# Altium integrated library Miscellaneous Devices LC.IntLib: 334 symbols (part 2 of 3) (continued)
## ZXCT1051 (continued)
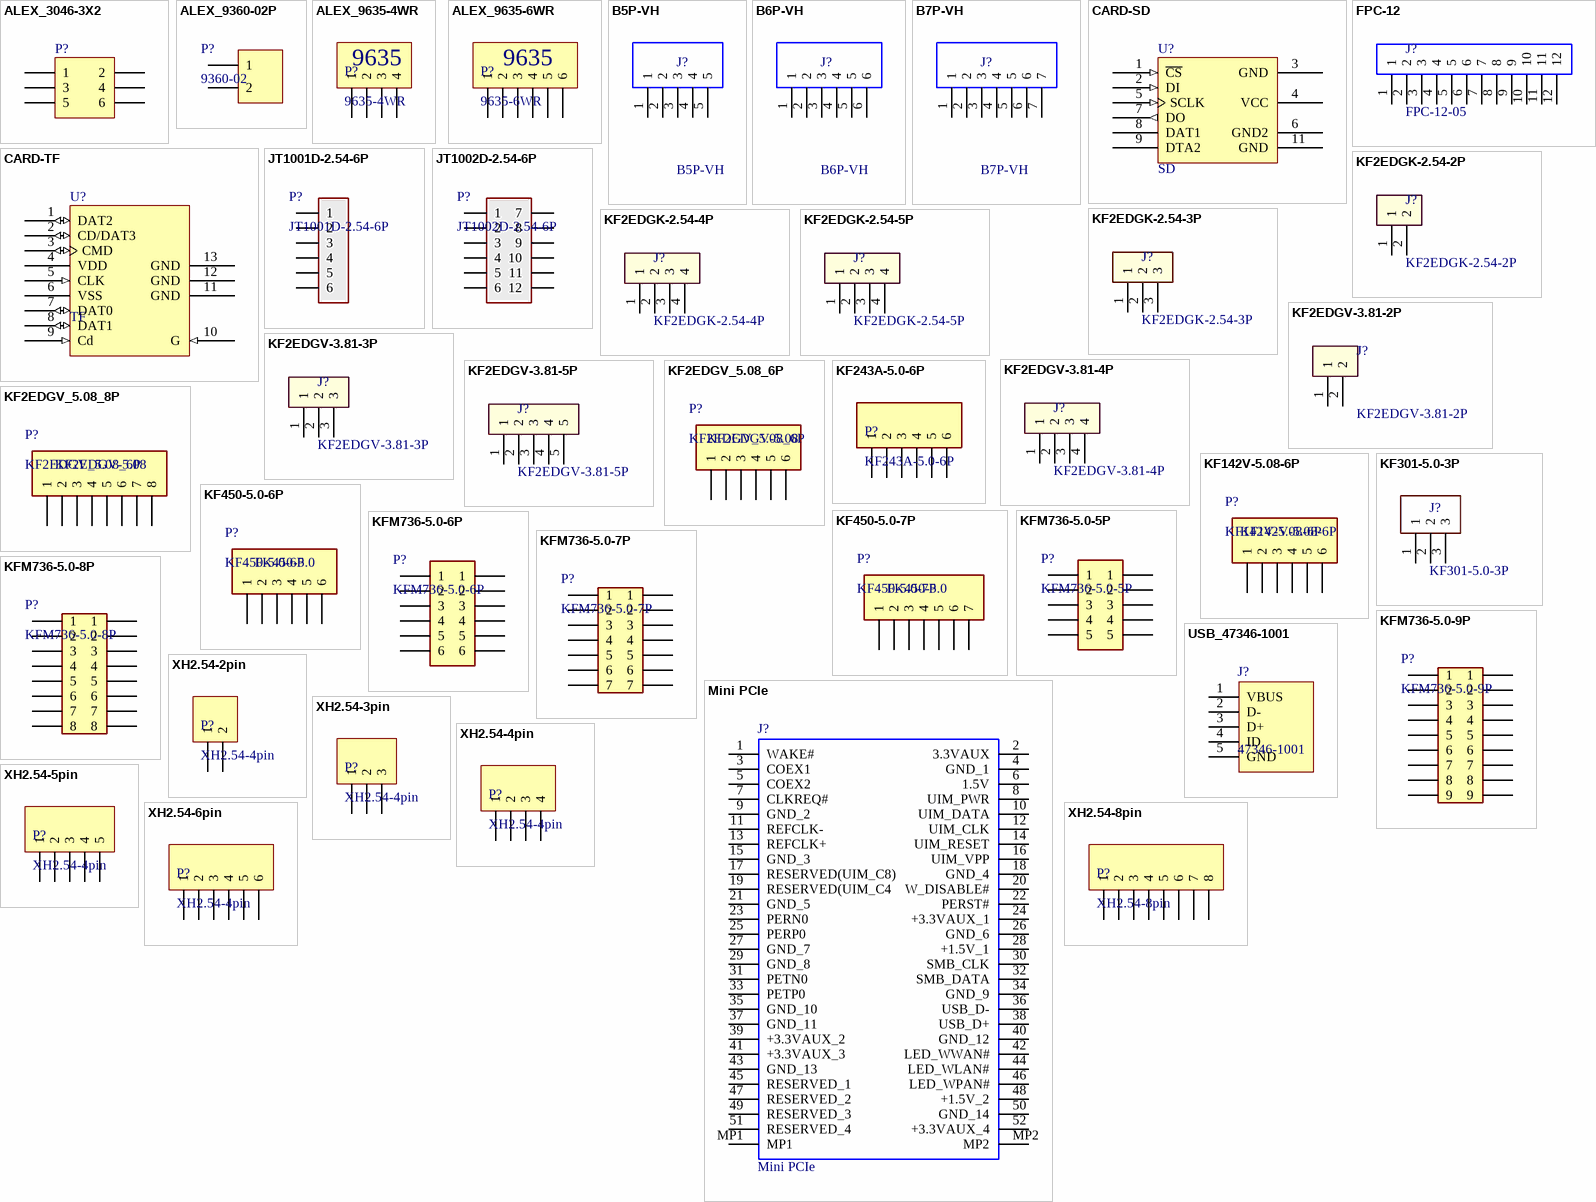
[diagram p17: symbols ALEX_3046-3X2 to XH2.54-8pin]

## ALEX_3046-3X2
designator P?, comment Header 3X2  (value not drawn)
ALEX3046-6P; LatestRevisionDate: 17-Jul-2002; LatestRevisionNote: Re-released for DXP Platform.; Publisher: Altium Limited; ComponentLink1Description: 网络链接; ComponentLink1URL: http://www.alexconn.net/c552.html
footprint ALEX_3046-N (配套3025-N)
pins: 1, 2, 3, 4, 5, 6

## ALEX_9360-02P
designator P?, comment 9360-02
Mini Fit直角接头/ .165“（4.20mm）电源连接器; ComponentLink1Description: 产品网络链接; ComponentLink1URL: http://www.alexconn.net/c521.html
footprint ALEX_9360-2P (Mini Fit直角接头/ .165“（4.20mm）电源连接器)
pins: 1, 2

## ALEX_9635-4WR
designator P?, comment 9635-4WR
直角接头6.35电源连接器; ComponentLink1Description: 产品网络链接; ComponentLink1URL: http://www.alexconn.net/c790.html
footprint ALEX_9635-4WR (Footprint not found)
pins: 1, 2, 3, 4
text: 9635

## ALEX_9635-6WR
designator P?, comment 9635-6WR
直角接头6.35电源连接器; ComponentLink1Description: 产品网络链接; ComponentLink1URL: http://www.alexconn.net/c790.html
footprint ALEX_9635-6WR (亚达康电源连接器)
pins: 1, 2, 3, 4, 5, 6
text: 9635

## B5P-VH
designator J?
VH-3.96mm Header top entry 5 way JST VH Series, Series Number B5P, 3.96mm Pitch 5 Way 1 Row Shrouded Straight PCB Header, Through Hole; Manufacturer_Name: JST (JAPAN SOLDERLESS TERMINALS); Manufacturer_Part_Number: B5P-VH(LF)(SN); Geometry.Height: 10.9mm; RS Part Number: 8201169P; RS Price/Stock: http://china.rs-online.com/web/p/products/8201169P; Arrow Part Number: B5P-VH(LF)(SN); Arrow Price/Stock: https://www.arrow.com/en/products/b5p-vh-lf-sn/jst-manufacturing; Datasheet Link: https://componentsearchengine.com/Datasheets/2/B5P-VH(LF)(SN).pdf; ComponentLink1Description: 供应商; ComponentLink1URL: https://item.taobao.com/item.htm?spm=a230r.1.14.131.16e64711CxwvJs&id=531944925306&ns=1&abbucket=16#detail
footprint B5P-VH
pins: 1, 2, 3, 4, 5

## B6P-VH
designator J?
VH-3.96mm Header top entry 5 way JST VH Series, Series Number B5P, 3.96mm Pitch 5 Way 1 Row Shrouded Straight PCB Header, Through Hole; Manufacturer_Name: JST (JAPAN SOLDERLESS TERMINALS); Manufacturer_Part_Number: B5P-VH(LF)(SN); Geometry.Height: 10.9mm; RS Part Number: 8201169P; RS Price/Stock: http://china.rs-online.com/web/p/products/8201169P; Arrow Part Number: B5P-VH(LF)(SN); Arrow Price/Stock: https://www.arrow.com/en/products/b5p-vh-lf-sn/jst-manufacturing; Datasheet Link: https://componentsearchengine.com/Datasheets/2/B5P-VH(LF)(SN).pdf; ComponentLink1Description: 供应商; ComponentLink1URL: https://item.taobao.com/item.htm?spm=a230r.1.14.131.16e64711CxwvJs&id=531944925306&ns=1&abbucket=16#detail
footprint B6P-VH
pins: 1, 2, 3, 4, 5, 6

## B7P-VH
designator J?
VH-3.96mm Header top entry 5 way JST VH Series, Series Number B5P, 3.96mm Pitch 5 Way 1 Row Shrouded Straight PCB Header, Through Hole; Manufacturer_Name: JST (JAPAN SOLDERLESS TERMINALS); Manufacturer_Part_Number: B5P-VH(LF)(SN); Geometry.Height: 10.9mm; RS Part Number: 8201169P; RS Price/Stock: http://china.rs-online.com/web/p/products/8201169P; Arrow Part Number: B5P-VH(LF)(SN); Arrow Price/Stock: https://www.arrow.com/en/products/b5p-vh-lf-sn/jst-manufacturing; Datasheet Link: https://componentsearchengine.com/Datasheets/2/B5P-VH(LF)(SN).pdf; ComponentLink1Description: 供应商; ComponentLink1URL: https://item.taobao.com/item.htm?spm=a230r.1.14.131.16e64711CxwvJs&id=531944925306&ns=1&abbucket=16#detail
footprint B7P-VH
pins: 1, 2, 3, 4, 5, 6, 7

## CARD-SD
designator U?, comment SD
SD卡槽
footprint CARD-SD
pins: 1 ~{CS} (in), 2 DI (in), 3 GND (power), 4 VCC (power), 5 SCLK (in), 6 GND2 (power), 7 DO (out), 8 DAT1, 9 DTA2, 11 GND (power)

## CARD-TF
designator U?, comment TF
TF卡槽
footprint CARD-TF
pins: 1 DAT2 (io), 2 CD/DAT3 (io), 3 CMD (io), 4 VDD (power), 5 CLK (in), 6 VSS (power), 7 DAT0 (io), 8 DAT1 (io), 9 Cd (in), 10 G (in), 11 GND (power), 12 GND (power), 13 GND (power)

## FPC-12
designator J?, comment FPC-12-05
FPC贴片端子; Manufacturer_Name: CIXI KEFA ELECTRONICS; Manufacturer_Part_Number: KF2EDGV-3.81; Geometry.Height: 9.2mm; Mouser Part Number: *; Mouser Price/Stock: *; RS Part Number: *; RS Price/Stock: *; Datasheet Link: http://en.cnkefa.com/uploads/2016/07/121709071486.pdf; ComponentLink1Description: 生产商; ComponentLink1URL: http://www.sofng.com/FPC/FFCsocket/2015/0331/195.html
footprint FPC-12
pins: 1, 2, 3, 4, 5, 6, 7, 8, 9, 10, 11, 12

## JT1001D-2.54-6P
designator P?
俊腾连接器; ComponentLink1Description: 俊腾连接器; ComponentLink1URL: http://www.nb-junteng.cn/product_info.aspx?id=179&cid=26
pins: 1, 2, 3, 4, 5, 6

## JT1002D-2.54-6P
designator P?
俊腾连接器; ComponentLink1Description: 俊腾连接器; ComponentLink1URL: http://www.nb-junteng.cn/product_info.aspx?id=180&cid=26
pins: 1, 2, 3, 4, 5, 6, 7, 8, 9, 10, 11, 12

## KF2EDGK-2.54-2P
designator J?
科发端子; Manufacturer_Name: CIXI KEFA ELECTRONICS; Manufacturer_Part_Number: KF2EDGV-3.81; Geometry.Height: 9.2mm; Mouser Part Number: *; Mouser Price/Stock: *; RS Part Number: *; RS Price/Stock: *; Datasheet Link: http://en.cnkefa.com/uploads/2016/07/121709071486.pdf; ComponentLink1Description: 科发端子; ComponentLink1URL: http://www.cnkefa.com/product/3141.html
footprint KF2EDGK-2.54-2P
pins: 1, 2

## KF2EDGK-2.54-3P
designator J?
科发端子; Manufacturer_Name: CIXI KEFA ELECTRONICS; Manufacturer_Part_Number: KF2EDGV-3.81; Geometry.Height: 9.2mm; Mouser Part Number: *; Mouser Price/Stock: *; RS Part Number: *; RS Price/Stock: *; Datasheet Link: http://en.cnkefa.com/uploads/2016/07/121709071486.pdf; ComponentLink1Description: 科发端子; ComponentLink1URL: http://www.cnkefa.com/product/3141.html
footprint KF2EDGK-2.54-3P
pins: 1, 2, 3

## KF2EDGK-2.54-4P
designator J?
科发端子; Manufacturer_Name: CIXI KEFA ELECTRONICS; Manufacturer_Part_Number: KF2EDGV-3.81; Geometry.Height: 9.2mm; Mouser Part Number: *; Mouser Price/Stock: *; RS Part Number: *; RS Price/Stock: *; Datasheet Link: http://en.cnkefa.com/uploads/2016/07/121709071486.pdf; ComponentLink1Description: 科发端子; ComponentLink1URL: http://www.cnkefa.com/product/3141.html
footprint KF2EDGK-2.54-4P
pins: 1, 2, 3, 4

## KF2EDGK-2.54-5P
designator J?
科发端子; Manufacturer_Name: CIXI KEFA ELECTRONICS; Manufacturer_Part_Number: KF2EDGV-3.81; Geometry.Height: 9.2mm; Mouser Part Number: *; Mouser Price/Stock: *; RS Part Number: *; RS Price/Stock: *; Datasheet Link: http://en.cnkefa.com/uploads/2016/07/121709071486.pdf; ComponentLink1Description: 科发端子; ComponentLink1URL: http://www.cnkefa.com/product/3141.html
footprint KF2EDGV-3.81-4P
pins: 1, 2, 3, 4

## KF2EDGV-3.81-2P
designator J?
科发端子; Manufacturer_Name: CIXI KEFA ELECTRONICS; Geometry.Height: 9.2mm; Manufacturer_Part_Number: KF2EDGV-3.81; Mouser Part Number: *; Mouser Price/Stock: *; RS Part Number: *; RS Price/Stock: *; Datasheet Link: http://en.cnkefa.com/uploads/2016/07/121709071486.pdf
footprint KF2EDGV-3.81-2P
pins: 1, 2

## KF2EDGV-3.81-3P
designator J?
科发端子; Manufacturer_Name: CIXI KEFA ELECTRONICS; Geometry.Height: 9.2mm; Manufacturer_Part_Number: KF2EDGV-3.81; Mouser Part Number: *; Mouser Price/Stock: *; RS Part Number: *; RS Price/Stock: *; Datasheet Link: http://en.cnkefa.com/uploads/2016/07/121709071486.pdf; ComponentLink1Description: 科发端子; ComponentLink1URL: http://www.cnkefa.com/product/3731.html
footprint KF2EDGV-3.81-3P
pins: 1, 2, 3

## KF2EDGV-3.81-4P
designator J?
科发端子; Manufacturer_Name: CIXI KEFA ELECTRONICS; Geometry.Height: 9.2mm; Manufacturer_Part_Number: KF2EDGV-3.81; Mouser Part Number: *; Mouser Price/Stock: *; RS Part Number: *; RS Price/Stock: *; Datasheet Link: http://en.cnkefa.com/uploads/2016/07/121709071486.pdf; ComponentLink1Description: 科发端子; ComponentLink1URL: http://www.cnkefa.com/product/3731.html
footprint KF2EDGV-3.81-4P
pins: 1, 2, 3, 4

## KF2EDGV-3.81-5P
designator J?
科发端子; Manufacturer_Name: CIXI KEFA ELECTRONICS; Geometry.Height: 9.2mm; Manufacturer_Part_Number: KF2EDGV-3.81; Mouser Part Number: *; Mouser Price/Stock: *; RS Part Number: *; RS Price/Stock: *; Datasheet Link: http://en.cnkefa.com/uploads/2016/07/121709071486.pdf; ComponentLink1Description: 科发端子; ComponentLink1URL: http://www.cnkefa.com/product/3731.html
footprint KF2EDGV-3.81-5P (Footprint not found)
pins: 1, 2, 3, 4, 5

## KF2EDGV_5.08_6P
designator P?
科发端子; ComponentLink1Description: 科发端子; ComponentLink1URL: http://www.cnkefa.com/product/4691.html; ComponentLink2Description: 配套插入端子; ComponentLink2URL: http://www.cnkefa.com/product/3961.html
footprint KF2EDGV-5.08-6P
pins: 1, 2, 3, 4, 5, 6
text: KF2EDGV-5.08

## KF2EDGV_5.08_8P
designator P?, comment KF2EDGV_5.08_6P
科发端子; ComponentLink1Description: 科发端子; ComponentLink1URL: http://www.cnkefa.com/product/4691.html; ComponentLink2Description: 配套插入端子; ComponentLink2URL: http://www.cnkefa.com/product/3961.html
footprint KF2EDGV-5.08-8P
pins: 1, 2, 3, 4, 5, 6, 7, 8
text: KF2EDGV-5.08

## KF142V-5.08-6P
designator P?
科发端子; ComponentLink1Description: 科发端子; ComponentLink1URL: http://www.cnkefa.com/product/2161.html
footprint KF142V-5.08-6P
pins: 1, 2, 3, 4, 5, 6

## KF243A-5.0-6P
designator P?
科发端子
footprint KF243-5.0-6P
pins: 1, 2, 3, 4, 5, 6

## KF301-5.0-3P
designator J?
3pin端子; Manufacturer_Name: CIXI KEFA ELECTRONICS; Manufacturer_Part_Number: KF2EDGV-3.81; Geometry.Height: 9.2mm; Mouser Part Number: *; Mouser Price/Stock: *; RS Part Number: *; RS Price/Stock: *; Datasheet Link: http://en.cnkefa.com/uploads/2016/07/121709071486.pdf; ComponentLink1Description: 科发端子; ComponentLink1URL: http://www.cnkefa.com/product/3141.html
footprint KF301-5.0-3P
pins: 1, 2, 3

## KF450-5.0-6P
designator P?
科发端子; ComponentLink1Description: 科发端子; ComponentLink1URL: http://www.cnkefa.com/product/2471.html
footprint KF450-5.0-6P
pins: 1, 2, 3, 4, 5, 6
text: FK450-5.0

## KF450-5.0-7P
designator P?
科发端子; ComponentLink1Description: 科发端子; ComponentLink1URL: http://www.cnkefa.com/product/2471.html
footprint KF450-5.0-7P
pins: 1, 2, 3, 4, 5, 6, 7
text: FK450-5.0

## KFM736-5.0-5P
designator P?
科发端子; ComponentLink1Description: 科发端子; ComponentLink1URL: http://www.cnkefa.com/product/2471.html
footprint KFM736-5.0-5P
pins: 1, 1, 2, 2, 3, 3, 4, 4, 5, 5

## KFM736-5.0-6P
designator P?
科发端子; ComponentLink1Description: 科发端子; ComponentLink1URL: http://www.cnkefa.com/product/2471.html
footprint KFM736-5.0-6P
pins: 1, 1, 2, 2, 3, 3, 4, 4, 5, 5, 6, 6

## KFM736-5.0-7P
designator P?
科发端子; ComponentLink1Description: 科发端子; ComponentLink1URL: http://www.cnkefa.com/product/2471.html
footprint KFM736-5.0-7P
pins: 1, 1, 2, 2, 3, 3, 4, 4, 5, 5, 6, 6, 7, 7

## KFM736-5.0-8P
designator P?
科发端子; ComponentLink1Description: 科发端子; ComponentLink1URL: http://www.cnkefa.com/product/2471.html
footprint KFM736-5.0-8P
pins: 1, 1, 2, 2, 3, 3, 4, 4, 5, 5, 6, 6, 7, 7, 8, 8

## KFM736-5.0-9P
designator P?
科发端子; ComponentLink1Description: 科发端子; ComponentLink1URL: http://www.cnkefa.com/product/2471.html
footprint KFM736-5.0-9P
pins: 1, 1, 2, 2, 3, 3, 4, 4, 5, 5, 6, 6, 7, 7, 8, 8, 9, 9

## Mini PCIe
designator J?
PCI Express / PCI Connectors mSATA/mini PCI-E 5.2H Type I G/F; Manufacturer_Name: TE Connectivity; Manufacturer_Part_Number: 1775862-2; Geometry.Height: 5.2mm; Mouser Part Number: 571-1775862-2; Mouser Price/Stock: https://www.mouser.com/Search/Refine.aspx?Keyword=571-1775862-2; RS Part Number: *; RS Price/Stock: *; Datasheet Link: https://www.te.com/commerce/DocumentDelivery/DDEController?Action=srchrtrv&DocNm=1775862&DocType=Customer+Drawing&DocLang=English&DocFormat=pdf&PartCntxt=1775862-2
footprint Mini PCIe-C
pins: 1 WAKE#, 2 3.3VAUX, 3 COEX1, 4 GND_1, 5 COEX2, 6 1.5V, 7 CLKREQ#, 8 UIM_PWR, 9 GND_2, 10 UIM_DATA, 11 REFCLK-, 12 UIM_CLK, 13 REFCLK+, 14 UIM_RESET, 15 GND_3, 16 UIM_VPP, 17 RESERVED(UIM_C8), 18 GND_4, 19 RESERVED(UIM_C4, 20 W_DISABLE#, 21 GND_5, 22 PERST#, 23 PERN0, 24 +3.3VAUX_1, 25 PERP0, 26 GND_6, 27 GND_7, 28 +1.5V_1, 29 GND_8, 30 SMB_CLK, 31 PETN0, 32 SMB_DATA, 33 PETP0, 34 GND_9, 35 GND_10, 36 USB_D-, 37 GND_11, 38 USB_D+, 39 +3.3VAUX_2, 40 GND_12, 41 +3.3VAUX_3, 42 LED_WWAN#, 43 GND_13, 44 LED_WLAN#, 45 RESERVED_1, 46 LED_WPAN#, 47 RESERVED_2, 48 +1.5V_2, 49 RESERVED_3, 50 GND_14, 51 RESERVED_4, 52 +3.3VAUX_4, MP1, MP2

## USB_47346-1001
designator J?, comment 47346-1001
USB连接器; Manufacturer_Name: Molex; Manufacturer_Part_Number: 47346-1001; Mouser Part Number: 538-47346-1001; Mouser Price/Stock: https://www.mouser.com/Search/Refine.aspx?Keyword=538-47346-1001; RS Part Number: 1788764; RS Price/Stock: http://uk.rs-online.com/web/p/products/1788764; Datasheet Link: http://www.molex.com/webdocs/datasheets/pdf/en-us/0473461001_IO_CONNECTORS.pdf
footprint 47346-0001
pins: 1 VBUS, 2 D-, 3 D+, 4 ID, 5 GND

## XH2.54-2pin
designator P?, comment XH2.54-4pin
白色端子
footprint XH2.5-2P
pins: 1, 2

## XH2.54-3pin
designator P?, comment XH2.54-4pin
白色端子
footprint XH2.5-3P
pins: 1, 2, 3

## XH2.54-4pin
designator P?
白色端子
footprint XH2.5-4P
pins: 1, 2, 3, 4

## XH2.54-5pin
designator P?, comment XH2.54-4pin
白色端子
footprint XH2.54-5P
pins: 1, 2, 3, 4, 5

## XH2.54-6pin
designator P?, comment XH2.54-4pin
白色端子
footprint XH2.5-6P
pins: 1, 2, 3, 4, 5, 6

## XH2.54-8pin
designator P?
白色端子
footprint XH2.5-8P
pins: 1, 2, 3, 4, 5, 6, 7, 8


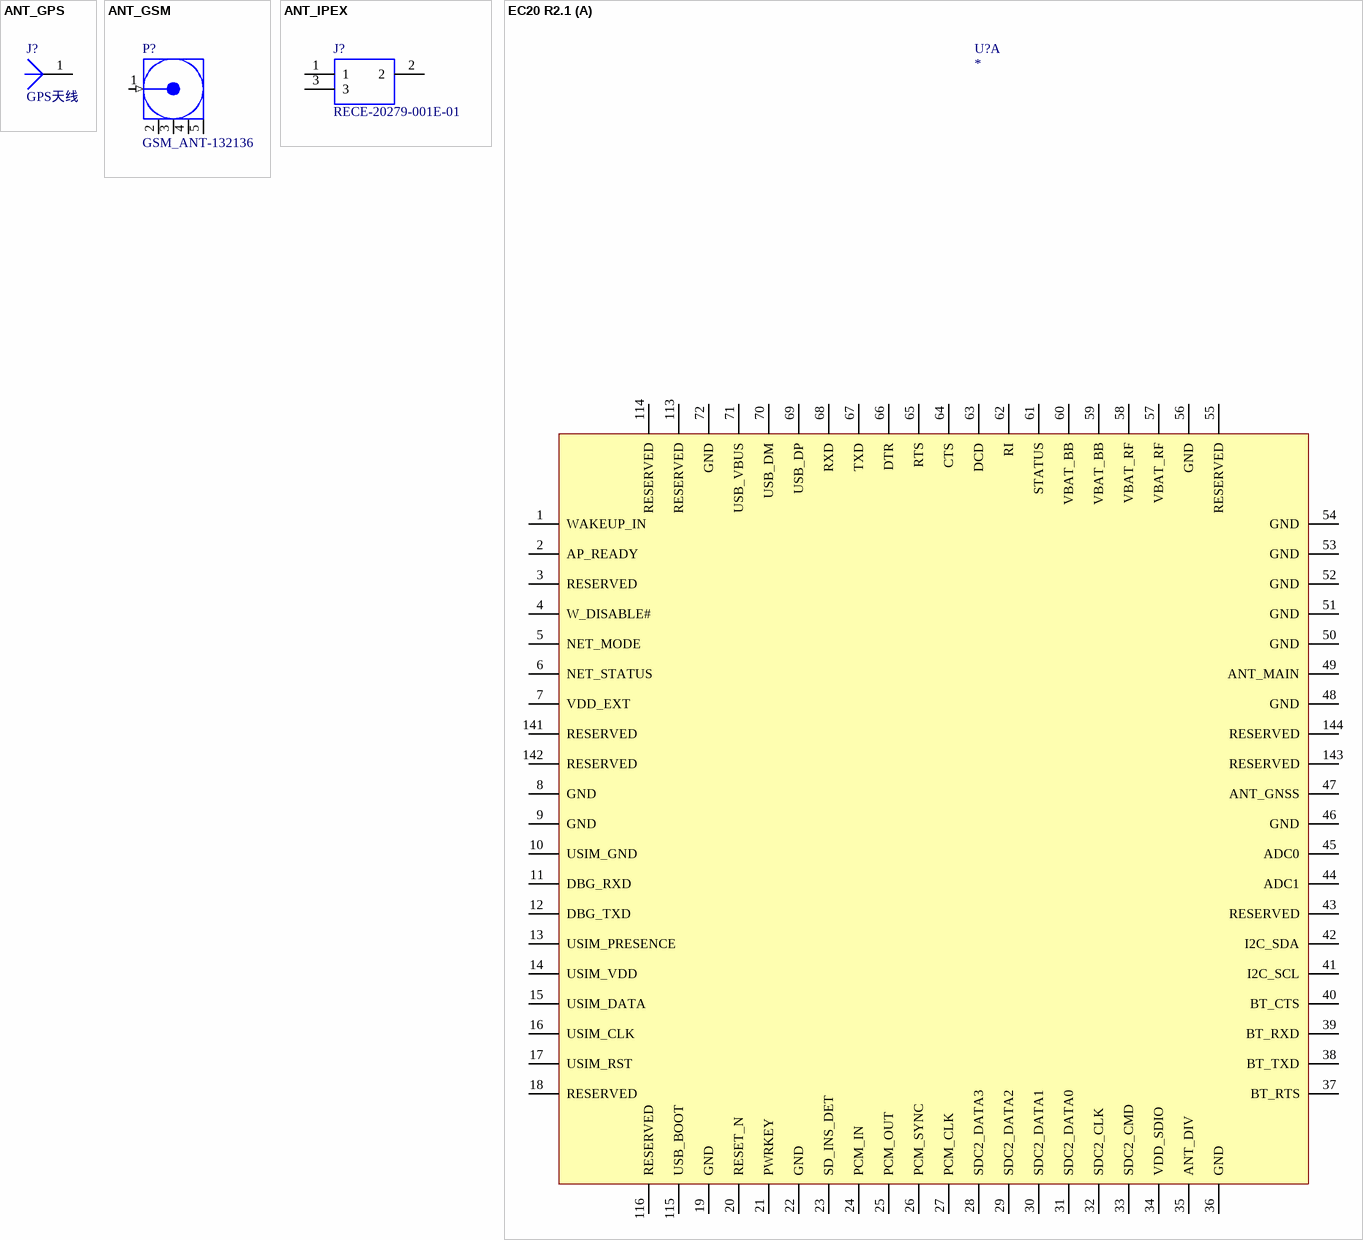
[diagram p18: symbols ANT_GPS to EC20 R2.1]

## ANT_GPS
designator J?, comment GPS天线
footprint ANT18*18*4mm (GPS天线18*18*4mm)
pins: 1

## ANT_GSM
designator P?, comment GSM_ANT-132136
RF Coaxial PCB Connector, MMCX; Thru-Hole, Vertical Mount Plug,  50 Ohm Impedance; PackageDocument: Rev. A, 16-Jun-1997; PCB_Layout: Complies with manufacturer's recommendation.; DrillSize: Corresponds to nominal value.; Published: 15-Jul-2004; LatestRevisionDate: 15-Jul-2004; LatestRevisionNote: Component Replaced.; DatasheetDocument: 30-May-2003; PackageReference: 908-21103; Publisher: Altium Limited; ComponentLink1Description: Manufacturer Link; ComponentLink1URL: http://www.amphenolrf.com/; ComponentLink2Description: 制造链接; ComponentLink2URL: http://www.rfsister.com/products/#; ComponentLink3Description: 销售链接; ComponentLink3URL: http://item.szlcsc.com/140889.html; ComponentLink4Description: 制造链接136134; ComponentLink4URL: https://www.amphenolrf.com/132134.html; ComponentLink5Description: 制造链接132136; ComponentLink5URL: https://www.amphenolrf.com/132136.html
footprint RF_SMA132136 (132136)
footprint RF_SMA132134 (132134)
pins: 1 Signal (in) "Signal Pin", 2 GND (power), 3 GND (power), 4 GND (power), 5 GND (power)

## ANT_IPEX
designator J?, comment RECE-20279-001E-01
RF Connectors / Coaxial Connectors ONBRD IPEX MHF RECEPTACLE; Manufacturer_Name: Taoglas; Manufacturer_Part_Number: RECE-20279-001E-01; RS Part Number: *; RS Price/Stock: *; Mouser Part Number: 960-RECE20279001E01; Mouser Price/Stock: https://www.mouser.com/Search/Refine.aspx?Keyword=960-RECE20279001E01; Datasheet Link: https://www.taoglas.com/wp-content/uploads/2016/04/RECE.20279.001E.01.pdf
footprint ANT_IPEX
pins: 1, 2, 3

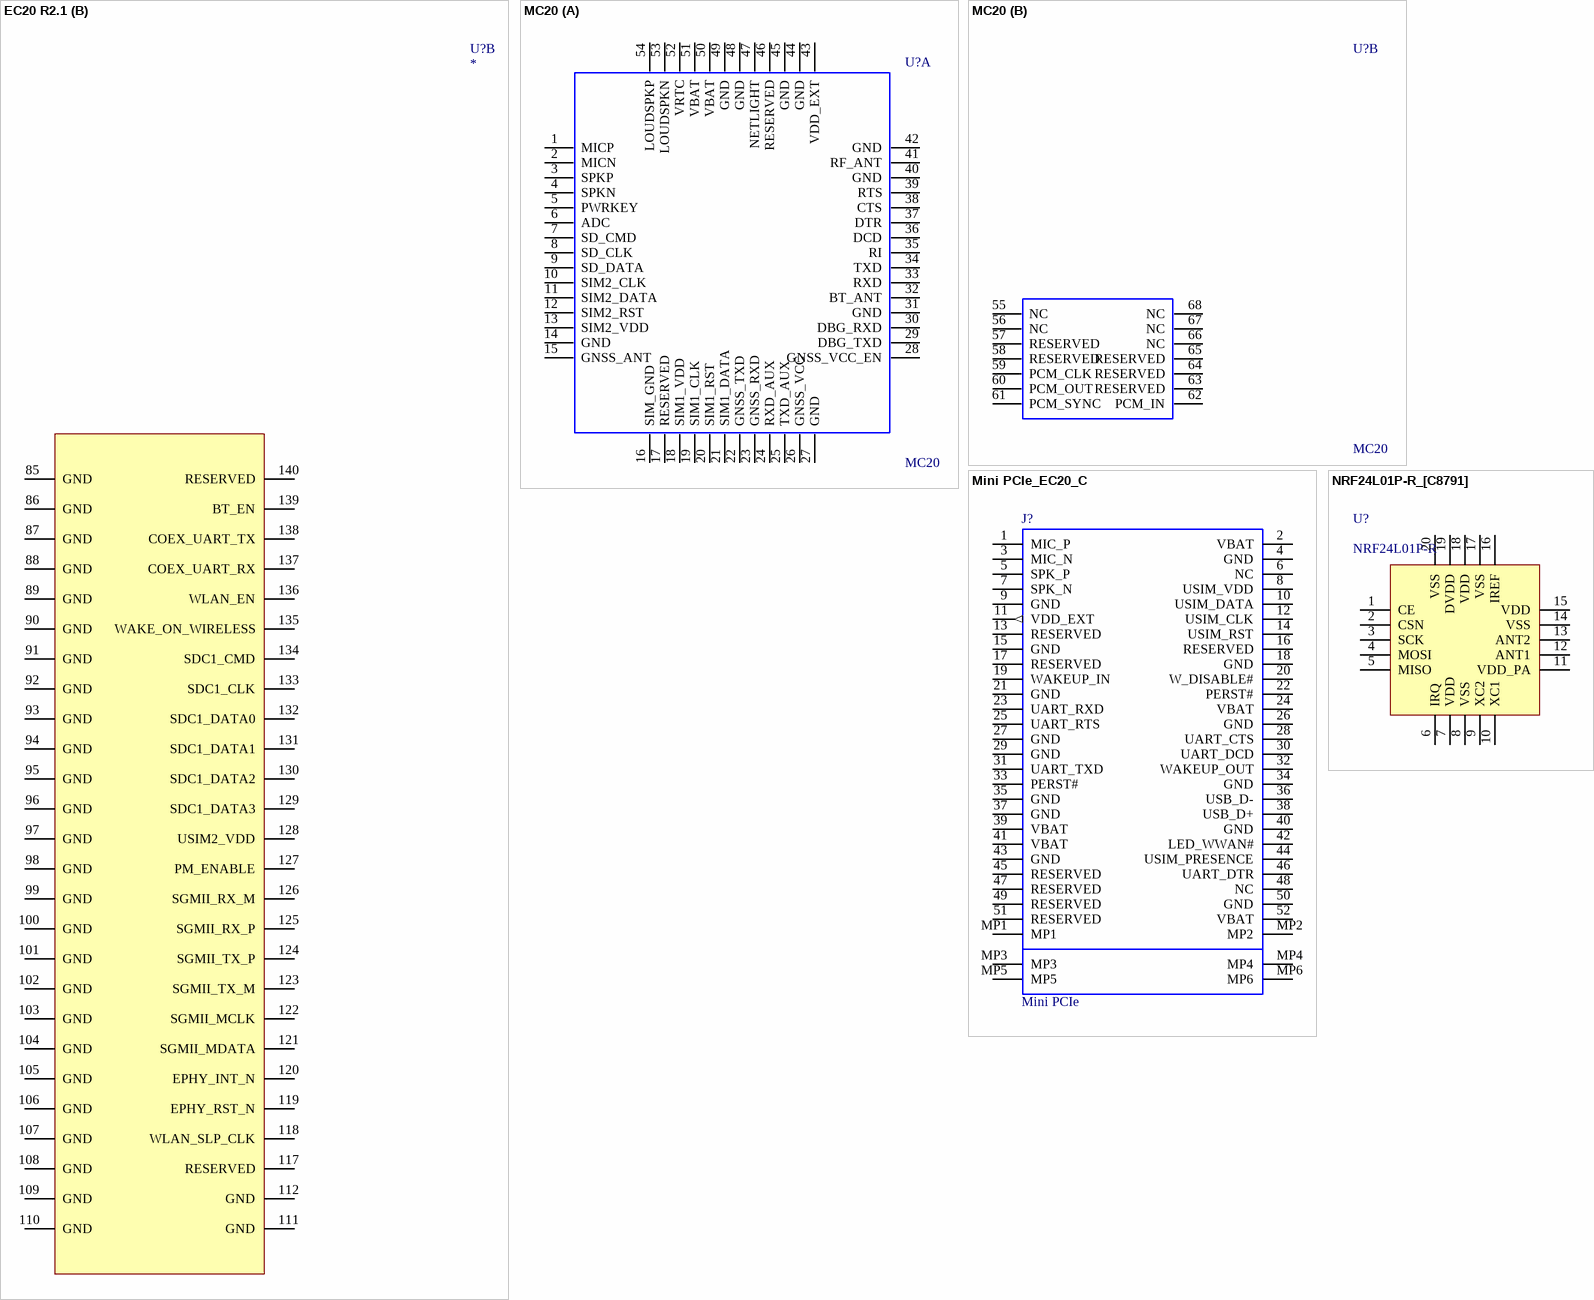
[diagram p19: symbols EC20 R2.1 to NRF24L01P-R_[C8791]]

## EC20 R2.1
designator U?
Value: *; Part Description: *; PCB DECAL: *
footprint EC20_R2.1
part A pins: 1 WAKEUP_IN, 2 AP_READY, 3 RESERVED, 4 W_DISABLE#, 5 NET_MODE, 6 NET_STATUS, 7 VDD_EXT, 8 GND, 9 GND, 10 USIM_GND, 11 DBG_RXD, 12 DBG_TXD, 13 USIM_PRESENCE, 14 USIM_VDD, 15 USIM_DATA, 16 USIM_CLK, 17 USIM_RST, 18 RESERVED, 19 GND, 20 RESET_N, 21 PWRKEY, 22 GND, 23 SD_INS_DET, 24 PCM_IN, 25 PCM_OUT, 26 PCM_SYNC, 27 PCM_CLK, 28 SDC2_DATA3, 29 SDC2_DATA2, 30 SDC2_DATA1, 31 SDC2_DATA0, 32 SDC2_CLK, 33 SDC2_CMD, 34 VDD_SDIO, 35 ANT_DIV, 36 GND, 37 BT_RTS, 38 BT_TXD, 39 BT_RXD, 40 BT_CTS, 41 I2C_SCL, 42 I2C_SDA, 43 RESERVED, 44 ADC1, 45 ADC0, 46 GND, 47 ANT_GNSS, 48 GND, 49 ANT_MAIN, 50 GND, 51 GND, 52 GND, 53 GND, 54 GND, 55 RESERVED, 56 GND, 57 VBAT_RF, 58 VBAT_RF, 59 VBAT_BB, 60 VBAT_BB, 61 STATUS, 62 RI, 63 DCD, 64 CTS, 65 RTS, 66 DTR, 67 TXD, 68 RXD, 69 USB_DP, 70 USB_DM, 71 USB_VBUS, 72 GND, 113 RESERVED, 114 RESERVED, 115 USB_BOOT, 116 RESERVED, 141 RESERVED, 142 RESERVED, 143 RESERVED, 144 RESERVED
part B pins: 85 GND, 86 GND, 87 GND, 88 GND, 89 GND, 90 GND, 91 GND, 92 GND, 93 GND, 94 GND, 95 GND, 96 GND, 97 GND, 98 GND, 99 GND, 100 GND, 101 GND, 102 GND, 103 GND, 104 GND, 105 GND, 106 GND, 107 GND, 108 GND, 109 GND, 110 GND, 111 GND, 112 GND, 117 RESERVED, 118 WLAN_SLP_CLK, 119 EPHY_RST_N, 120 EPHY_INT_N, 121 SGMII_MDATA, 122 SGMII_MCLK, 123 SGMII_TX_M, 124 SGMII_TX_P, 125 SGMII_RX_P, 126 SGMII_RX_M, 127 PM_ENABLE, 128 USIM2_VDD, 129 SDC1_DATA3, 130 SDC1_DATA2, 131 SDC1_DATA1, 132 SDC1_DATA0, 133 SDC1_CLK, 134 SDC1_CMD, 135 WAKE_ON_WIRELESS, 136 WLAN_EN, 137 COEX_UART_RX, 138 COEX_UART_TX, 139 BT_EN, 140 RESERVED
2 alternate drawings of the same symbol

## MC20
designator U?
PCB DECAL: MC20
footprint MC20
part A pins: 1 MICP, 2 MICN, 3 SPKP, 4 SPKN, 5 PWRKEY, 6 ADC, 7 SD_CMD, 8 SD_CLK, 9 SD_DATA, 10 SIM2_CLK, 11 SIM2_DATA, 12 SIM2_RST, 13 SIM2_VDD, 14 GND, 15 GNSS_ANT, 16 SIM_GND, 17 RESERVED, 18 SIM1_VDD, 19 SIM1_CLK, 20 SIM1_RST, 21 SIM1_DATA, 22 GNSS_TXD, 23 GNSS_RXD, 24 RXD_AUX, 25 TXD_AUX, 26 GNSS_VCC, 27 GND, 28 GNSS_VCC_EN, 29 DBG_TXD, 30 DBG_RXD, 31 GND, 32 BT_ANT, 33 RXD, 34 TXD, 35 RI, 36 DCD, 37 DTR, 38 CTS, 39 RTS, 40 GND, 41 RF_ANT, 42 GND, 43 VDD_EXT, 44 GND, 45 GND, 46 RESERVED, 47 NETLIGHT, 48 GND, 49 GND, 50 VBAT, 51 VBAT, 52 VRTC, 53 LOUDSPKN, 54 LOUDSPKP
part B pins: 55 NC, 56 NC, 57 RESERVED, 58 RESERVED, 59 PCM_CLK, 60 PCM_OUT, 61 PCM_SYNC, 62 PCM_IN, 63 RESERVED, 64 RESERVED, 65 RESERVED, 66 NC, 67 NC, 68 NC

## Mini PCIe_EC20_C
designator J?, comment Mini PCIe
PCI Express / PCI Connectors mSATA/mini PCI-E 5.2H Type I G/F; Manufacturer_Name: TE Connectivity; Manufacturer_Part_Number: 1775862-2; Geometry.Height: 5.2mm; Mouser Part Number: 571-1775862-2; Mouser Price/Stock: https://www.mouser.com/Search/Refine.aspx?Keyword=571-1775862-2; RS Part Number: *; RS Price/Stock: *; Datasheet Link: https://www.te.com/commerce/DocumentDelivery/DDEController?Action=srchrtrv&DocNm=1775862&DocType=Customer+Drawing&DocLang=English&DocFormat=pdf&PartCntxt=1775862-2
footprint Mini PCIe-EC20
pins: 1 MIC_P, 2 VBAT, 3 MIC_N, 4 GND, 5 SPK_P, 6 NC, 7 SPK_N, 8 USIM_VDD, 9 GND, 10 USIM_DATA, 11 VDD_EXT (out), 12 USIM_CLK, 13 RESERVED, 14 USIM_RST, 15 GND, 16 RESERVED, 17 RESERVED, 18 GND, 19 WAKEUP_IN, 20 W_DISABLE#, 21 GND, 22 PERST#, 23 UART_RXD, 24 VBAT, 25 UART_RTS, 26 GND, 27 GND, 28 UART_CTS, 29 GND, 30 UART_DCD, 31 UART_TXD, 32 WAKEUP_OUT, 33 PERST#, 34 GND, 35 GND, 36 USB_D-, 37 GND, 38 USB_D+, 39 VBAT, 40 GND, 41 VBAT, 42 LED_WWAN#, 43 GND, 44 USIM_PRESENCE, 45 RESERVED, 46 UART_DTR, 47 RESERVED, 48 NC, 49 RESERVED, 50 GND, 51 RESERVED, 52 VBAT, MP1, MP2, MP3, MP4, MP5, MP6

## NRF24L01P-R_[C8791]
designator U?, comment NRF24L01P-R
无线; ComponentLink1Description: 供应商链接; ComponentLink1URL: http://www.szlcsc.com/product/details_9305.html; Package: QFN-20_4x4x05P; Supplier: LC; SuppliersPartNumber: C8791
footprint QFN-20_4x4x05P
pins: 1 CE, 2 CSN, 3 SCK, 4 MOSI, 5 MISO, 6 IRQ, 7 VDD, 8 VSS, 9 XC2, 10 XC1, 11 VDD_PA, 12 ANT1, 13 ANT2, 14 VSS, 15 VDD, 16 IREF, 17 VSS, 18 VDD, 19 DVDD, 20 VSS

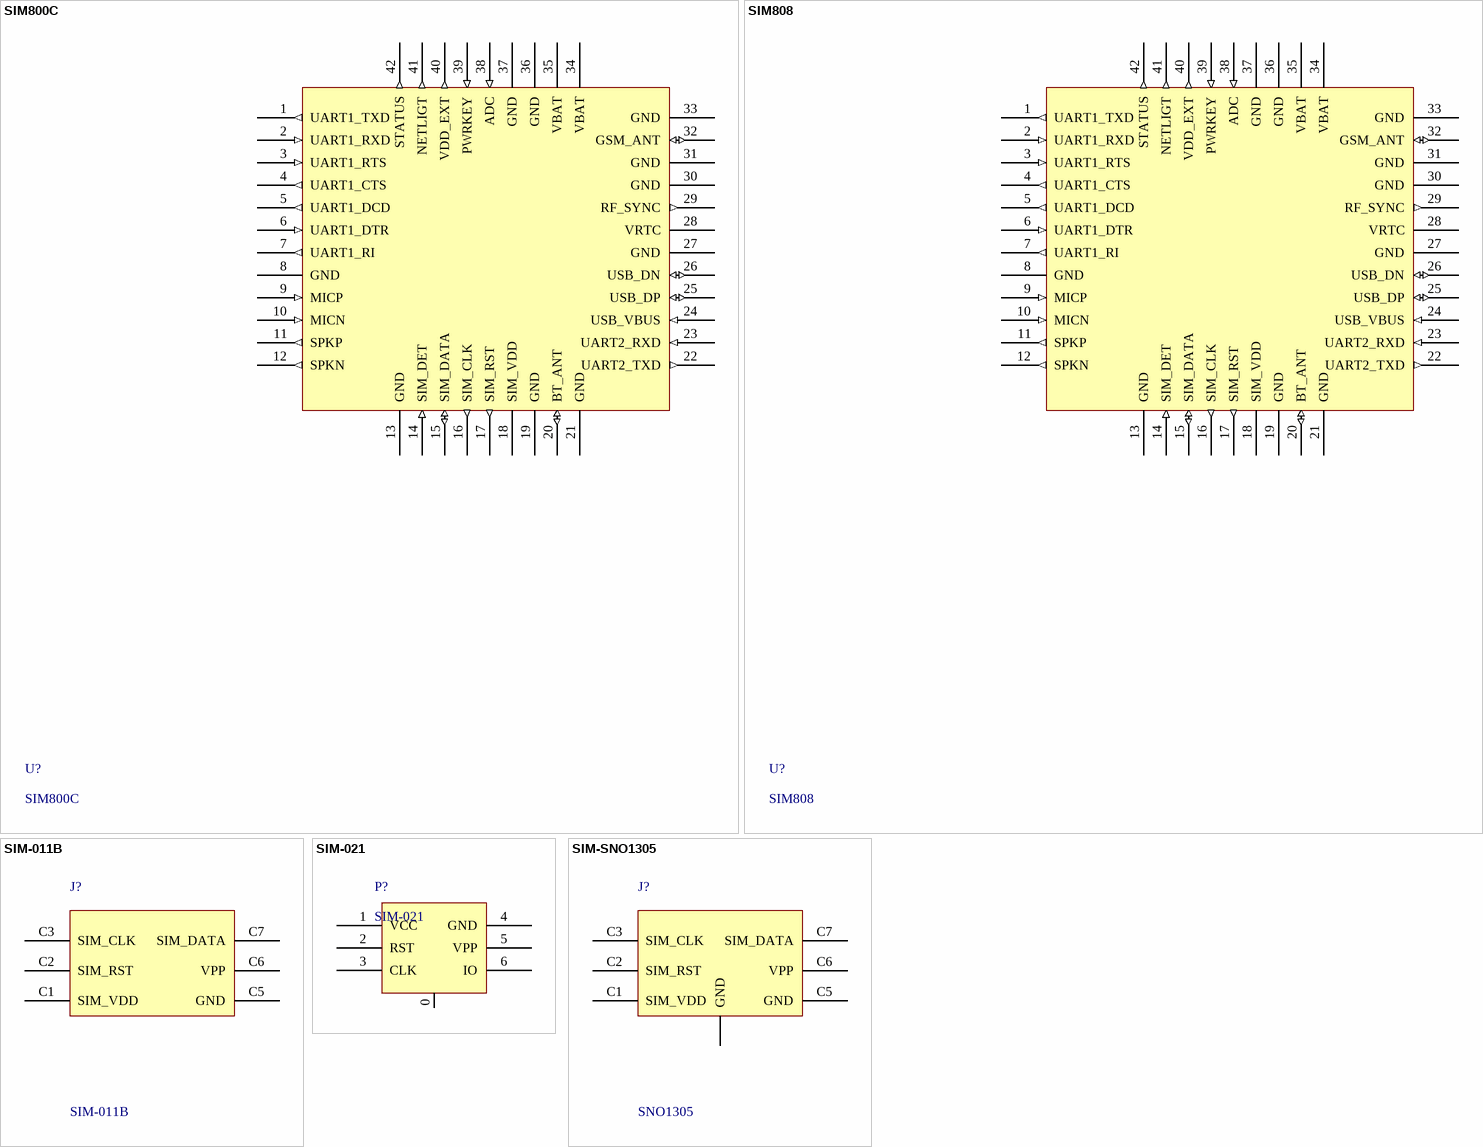
[diagram p20: symbols SIM800C to SIM-SNO1305]

## SIM800C
designator U?
SIM800C_42PIN; ComponentLink1Description: 生产厂链接; ComponentLink1URL: http://www.simcomm2m.com/module/detail.aspx?id=11
footprint SIM800C_42PIN (SIM800C)
pins: 1 UART1_TXD (out), 2 UART1_RXD (in), 3 UART1_RTS (in), 4 UART1_CTS (out), 5 UART1_DCD (out), 6 UART1_DTR (in), 7 UART1_RI (out), 8 GND (power), 9 MICP (in), 10 MICN (in), 11 SPKP (out), 12 SPKN (out), 13 GND (power), 14 SIM_DET (in), 15 SIM_DATA (io), 16 SIM_CLK (out), 17 SIM_RST (out), 18 SIM_VDD (power), 19 GND (power), 20 BT_ANT (io), 21 GND (power), 22 UART2_TXD (out), 23 UART2_RXD (in), 24 USB_VBUS (in), 25 USB_DP (io), 26 USB_DN (io), 27 GND (power), 28 VRTC (power), 29 RF_SYNC (out), 30 GND (power), 31 GND (power), 32 GSM_ANT (io), 33 GND (power), 34 VBAT (power), 35 VBAT (power), 36 GND (power), 37 GND (power), 38 ADC (in), 39 PWRKEY (in), 40 VDD_EXT (out), 41 NETLIGT (out), 42 STATUS (out)

## SIM808
designator U?
ComponentLink1Description: 生产厂链接; ComponentLink1URL: http://www.simcomm2m.com/module/detail.aspx?id=11
pins: 1 UART1_TXD (out), 2 UART1_RXD (in), 3 UART1_RTS (in), 4 UART1_CTS (out), 5 UART1_DCD (out), 6 UART1_DTR (in), 7 UART1_RI (out), 8 GND (power), 9 MICP (in), 10 MICN (in), 11 SPKP (out), 12 SPKN (out), 13 GND (power), 14 SIM_DET (in), 15 SIM_DATA (io), 16 SIM_CLK (out), 17 SIM_RST (out), 18 SIM_VDD (power), 19 GND (power), 20 BT_ANT (io), 21 GND (power), 22 UART2_TXD (out), 23 UART2_RXD (in), 24 USB_VBUS (in), 25 USB_DP (io), 26 USB_DN (io), 27 GND (power), 28 VRTC (power), 29 RF_SYNC (out), 30 GND (power), 31 GND (power), 32 GSM_ANT (io), 33 GND (power), 34 VBAT (power), 35 VBAT (power), 36 GND (power), 37 GND (power), 38 ADC (in), 39 PWRKEY (in), 40 VDD_EXT (out), 41 NETLIGT (out), 42 STATUS (out)

## SIM-011B
designator J?
ComponentLink1Description: SIM-011B; ComponentLink1URL: http://www.ciodin.com/sim-show-78.html
footprint SIM-011B (SIM卡座)
pins: C1 SIM_VDD, C2 SIM_RST, C3 SIM_CLK, C5 GND, C6 VPP, C7 SIM_DATA

## SIM-021
designator P?
SIM卡座; ComponentLink1Description: 生产厂家链接; ComponentLink1URL: http://www.ciodin.com/sim-show-90.html; ComponentLink2Description: 贸易商链接; ComponentLink2URL: http://item.szlcsc.com/112423.html
footprint SIM-021 (sim卡座)
pins: 0, 1 VCC, 2 RST, 3 CLK, 4 GND, 5 VPP, 6 IO

## SIM-SNO1305
designator J?, comment SNO1305
SIM卡座; ComponentLink1Description: 生产商; ComponentLink1URL: http://www.sofng.com/SIM/NANO_SIM__MEMORY_CARD_SOCKETS_/2016/0118/621.html
footprint SIM-SNO1305 (sim卡座)
pins: 0 GND (power), C1 SIM_VDD, C2 SIM_RST, C3 SIM_CLK, C5 GND, C6 VPP, C7 SIM_DATA


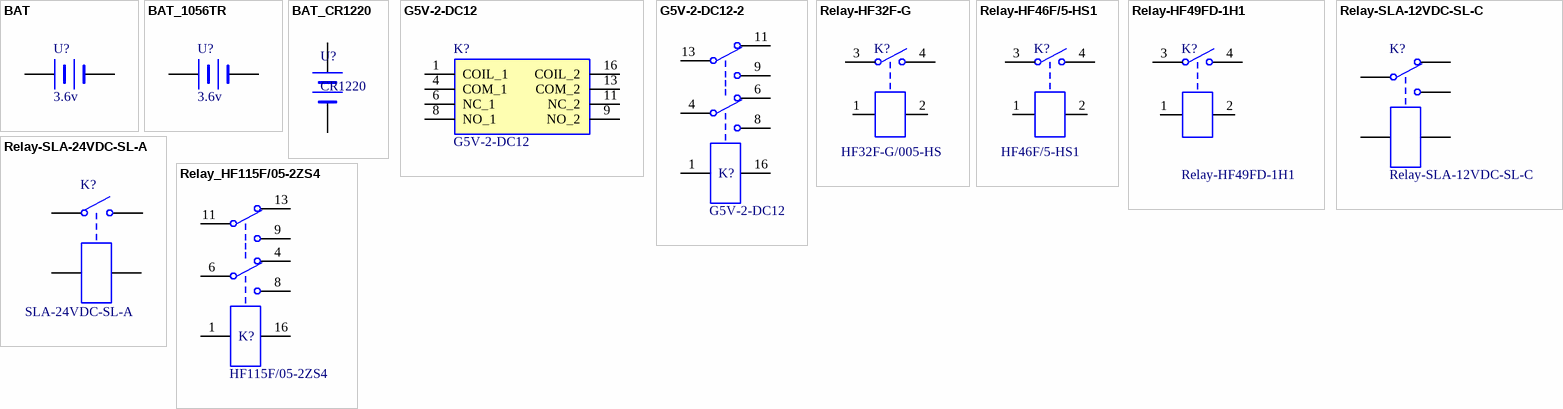
[diagram p21: symbols BAT to Relay_HF115F/05-2ZS4]

## BAT
designator U?, comment 3.6v
Battery
footprint BAT1
pins: 1 +, 2 -
2 alternate drawings of the same symbol

## BAT_1056TR
designator U?, comment 3.6v
1056TR; ComponentLink1Description: 经销商; ComponentLink1URL: https://item.szlcsc.com/237316.html
footprint BAT_1056TR
pins: 1 +, 2 -
2 alternate drawings of the same symbol

## BAT_CR1220
designator U?, comment CR1220
CR1220卧式
footprint BAT_CR1220 (CR1220卧式)
pins: 1 +, 2 -

## G5V-2-DC12
designator K?
小功率继电器; Manufacturer_Name: Omron Electronics; Allied_Number: 70176230; Geometry.Height: 11mm; Manufacturer_Part_Number: G5V-2-DC12; Mouser Part Number: 653-G5V-2-DC12; Mouser Price/Stock: https://www.mouser.com/Search/Refine.aspx?Keyword=653-G5V-2-DC12; RS Part Number: *; RS Price/Stock: *; Allied Price/Stock: https://www.alliedelec.com/omronelectroniccomponents-g5v-2-dc12/70176230/; Datasheet Link: https://omronfs.omron.com/en_US/ecb/products/pdf/en-g5v2.pdf; ComponentLink1Description: 销售商; ComponentLink1URL: https://item.szlcsc.com/28839.html; ComponentLink2Description: 生产商; ComponentLink2URL: https://www.ecb.omron.com.cn/parametric-search?nodeId=1701010&nodeParentId=17010
footprint G5V2H1DC9
pins: 1 COIL_1, 4 COM_1, 6 NC_1, 8 NO_1, 9 NO_2, 11 NC_2, 13 COM_2, 16 COIL_2

## G5V-2-DC12-2
designator K?, comment G5V-2-DC12
OMRON; Published: 24-Mar-1999; LatestRevisionDate: 17-Jul-2002; LatestRevisionNote: Re-released for DXP Platform.; PackageReference: MODULE5B; Publisher: Altium Limited
footprint G5V2H1DC9
pins: 1 COIL, 4 COM1, 6 NC1, 8 NO1, 9 NO2, 11 NC2, 13 COM2, 16 COIL

## Relay-HF32F-G 
designator K?, comment HF32F-G/005-HS
宏发继电器; Published: 24-Mar-1999; LatestRevisionDate: 17-Jul-2002; LatestRevisionNote: Re-released for DXP Platform.; PackageReference: MODULE5B; Publisher: Altium Limited; ComponentLink1Description: 制造商链接; ComponentLink1URL: http://cn.hongfa.com/pro/html/HF49FD_I_cn.html
footprint HF32F-H
pins: 1, 2, 3, 4

## Relay-HF46F/5-HS1
designator K?, comment HF46F/5-HS1
宏发继电器; Published: 24-Mar-1999; LatestRevisionDate: 17-Jul-2002; LatestRevisionNote: Re-released for DXP Platform.; PackageReference: MODULE5B; Publisher: Altium Limited; ComponentLink1Description: 制造商链接; ComponentLink1URL: http://cn.hongfa.com/pro/html/HF49FD_I_cn.html
footprint HF46F
pins: 1, 2, 3, 4

## Relay-HF49FD-1H1
designator K?
Published: 24-Mar-1999; LatestRevisionDate: 17-Jul-2002; LatestRevisionNote: Re-released for DXP Platform.; PackageReference: MODULE5B; Publisher: Altium Limited; ComponentLink1Description: 制造商链接; ComponentLink1URL: http://cn.hongfa.com/pro/html/HF49FD_I_cn.html
footprint HF49FD-1H1
pins: 1, 2, 3, 4

## Relay-SLA-12VDC-SL-C
designator K?
SLA-12VDC-SL-C转换型; Published: 24-Mar-1999; LatestRevisionDate: 17-Jul-2002; LatestRevisionNote: Re-released for DXP Platform.; PackageReference: MODULE5B; Publisher: Altium Limited; ComponentLink1Description: 产品链接; ComponentLink1URL: http://www.songlerelay.com/Product_show_id_120.htm
footprint RELAY_SLA-12VDC-SL-C -5P
pins: 1, 2, 3, 4, 5

## Relay-SLA-24VDC-SL-A
designator K?, comment SLA-24VDC-SL-A
SLA-24VDC-SL-A /30A; Published: 24-Mar-1999; LatestRevisionDate: 17-Jul-2002; LatestRevisionNote: Re-released for DXP Platform.; PackageReference: MODULE5B; Publisher: Altium Limited; ComponentLink1Description: 产品链接; ComponentLink1URL: http://www.songlerelay.com/Product_show_id_120.htm
footprint RELAY_SLA-24VDC-SL-A
pins: 1, 3, 4, 5

## Relay_HF115F/05-2ZS4
designator K?, comment HF115F/05-2ZS4
COIL:DC5V;8A 250VAC; Published: 24-Mar-1999; LatestRevisionDate: 17-Jul-2002; LatestRevisionNote: Re-released for DXP Platform.; PackageReference: MODULE5B; Publisher: Altium Limited
footprint HF115F/005-2ZS4
pins: 1 COIL, 4 NC1, 6 COM1, 8 NO1, 9 NO2, 11 COM2, 13 NC2, 16 COIL


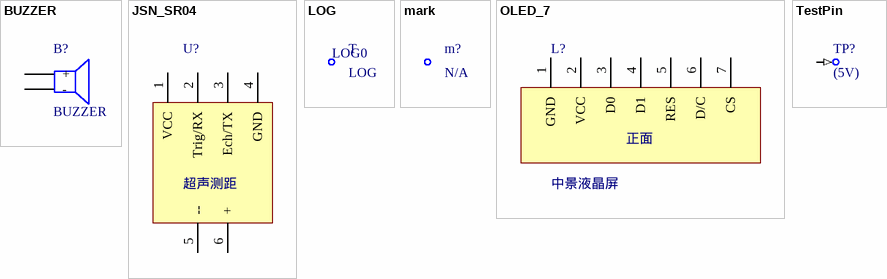
[diagram p22: symbols BUZZER to TestPin]

## BUZZER
designator B?
蜂鸣器; Published: 24-Mar-1999; LatestRevisionDate: 17-Jul-2002; LatestRevisionNote: Re-released for DXP Platform.; PackageReference: PIN2; Publisher: Altium Limited
footprint BUZZER (蜂鸣器)
pins: 1 +, 2 -

## JSN_SR04
designator U?, comment 超声测距
footprint JSN_SR04 (Connector; Header; 4 Position)
pins: 1 VCC, 2 Trig/RX, 3 Ech/TX, 4 GND, 5 --, 6 +

## LOG
designator T  (no BOM)
footprint LOG0
text: LOG0

## mark
designator m?, comment N/A  (no BOM)
footprint Mark

## OLED_7
designator L?, comment 中景液晶屏
1.3英寸OLED中景
footprint OLED_1.3INQ
pins: 1 GND, 2 VCC, 3 D0, 4 D1, 5 RES, 6 D/C, 7 CS
text: 正面

## TestPin
designator TP?, comment (5V)  (no BOM)
footprint TP
pins: 1 (in)


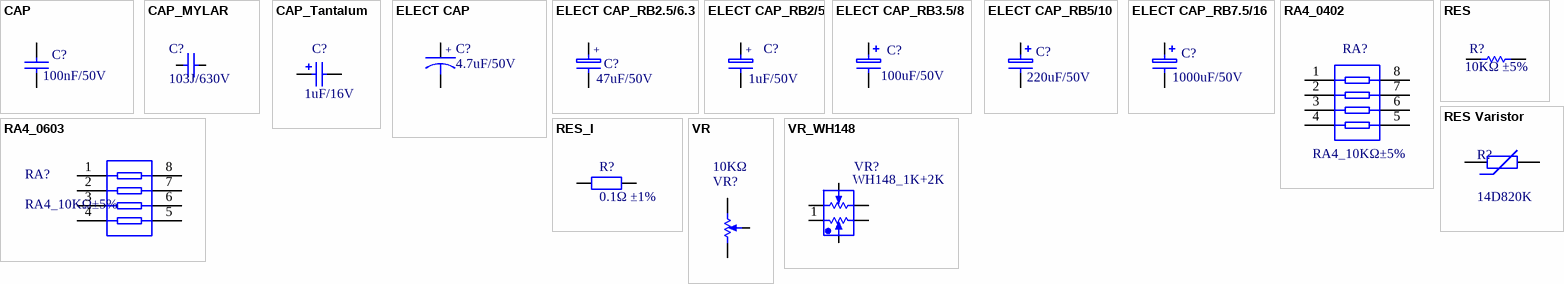
[diagram p23: symbols CAP to VR_WH148]

## CAP
designator C?, comment 100nF/50V
贴片电容; ComponentLink1Description: 供应商链接; ComponentLink1URL: http://www.szlcsc.com/product/details_1875.html; Package: 0402; Supplier: LC; SuppliersPartNumber: C1523
footprint 0402_C
footprint 0603_C
footprint 0805_C
footprint 1206_C
footprint 1210_C
footprint 1806_C
footprint 2220_C
pins: 1, 2

## CAP_MYLAR
designator C?, comment 103J/630V
涤纶电容; ComponentLink1Description: 供应商链接; ComponentLink1URL: http://www.szlcsc.com/product/details_1875.html; Package: 0402; Supplier: LC; SuppliersPartNumber: C1523
footprint CAP-CBB
pins: 1, 2

## CAP_Tantalum
designator C?, comment 1uF/16V
钽电容; ComponentLink1Description: 供应商链接; ComponentLink1URL: http://www.szlcsc.com/product/details_16815.html; Package: 3528; Supplier: LC; SuppliersPartNumber: C16133
footprint CASE-B_3528
footprint CASE-C_6032
footprint CASE-D_7343
footprint CASE-E_7343
footprint CASE-A_3216
pins: 1, 2

## ELECT CAP
designator C?, comment 4.7uF/50V
电解电容; 紅坝1: 醇腳; 基1: 0.161; 基2: 0.2317; 紅坝2: 惩; へ: 4X5.4; м砃戈2: *; м砃戈3: *; SAP: *; 基3: *; 紅坝3: *
footprint RB2/5
footprint RB2.5/6.3
footprint RB3.5/8
footprint RB5/10
footprint RB7.5/16
pins: 1, 2
text: +

## ELECT CAP_RB2.5/6.3
designator C?, comment 47uF/50V
电解电容
footprint RB2.5/6.3
pins: 1, 2
text: +

## ELECT CAP_RB2/5
designator C?, comment 1uF/50V
电解电容
footprint RB2/5
pins: 1, 2
text: +